# Altium footprint library Footprints_SOC.PcbLib: 201 footprints (part 4 of 13)
Each footprint in its own frame and in the unit in brackets; x right, y up, seen from the top. Pads: shape width x height; smd on the part's side, far side on the other; paste and mask are expansions set on the pad; w line width, h text height; cw(c..) or ccw(c..) is an arc to the next point about the centre after c.
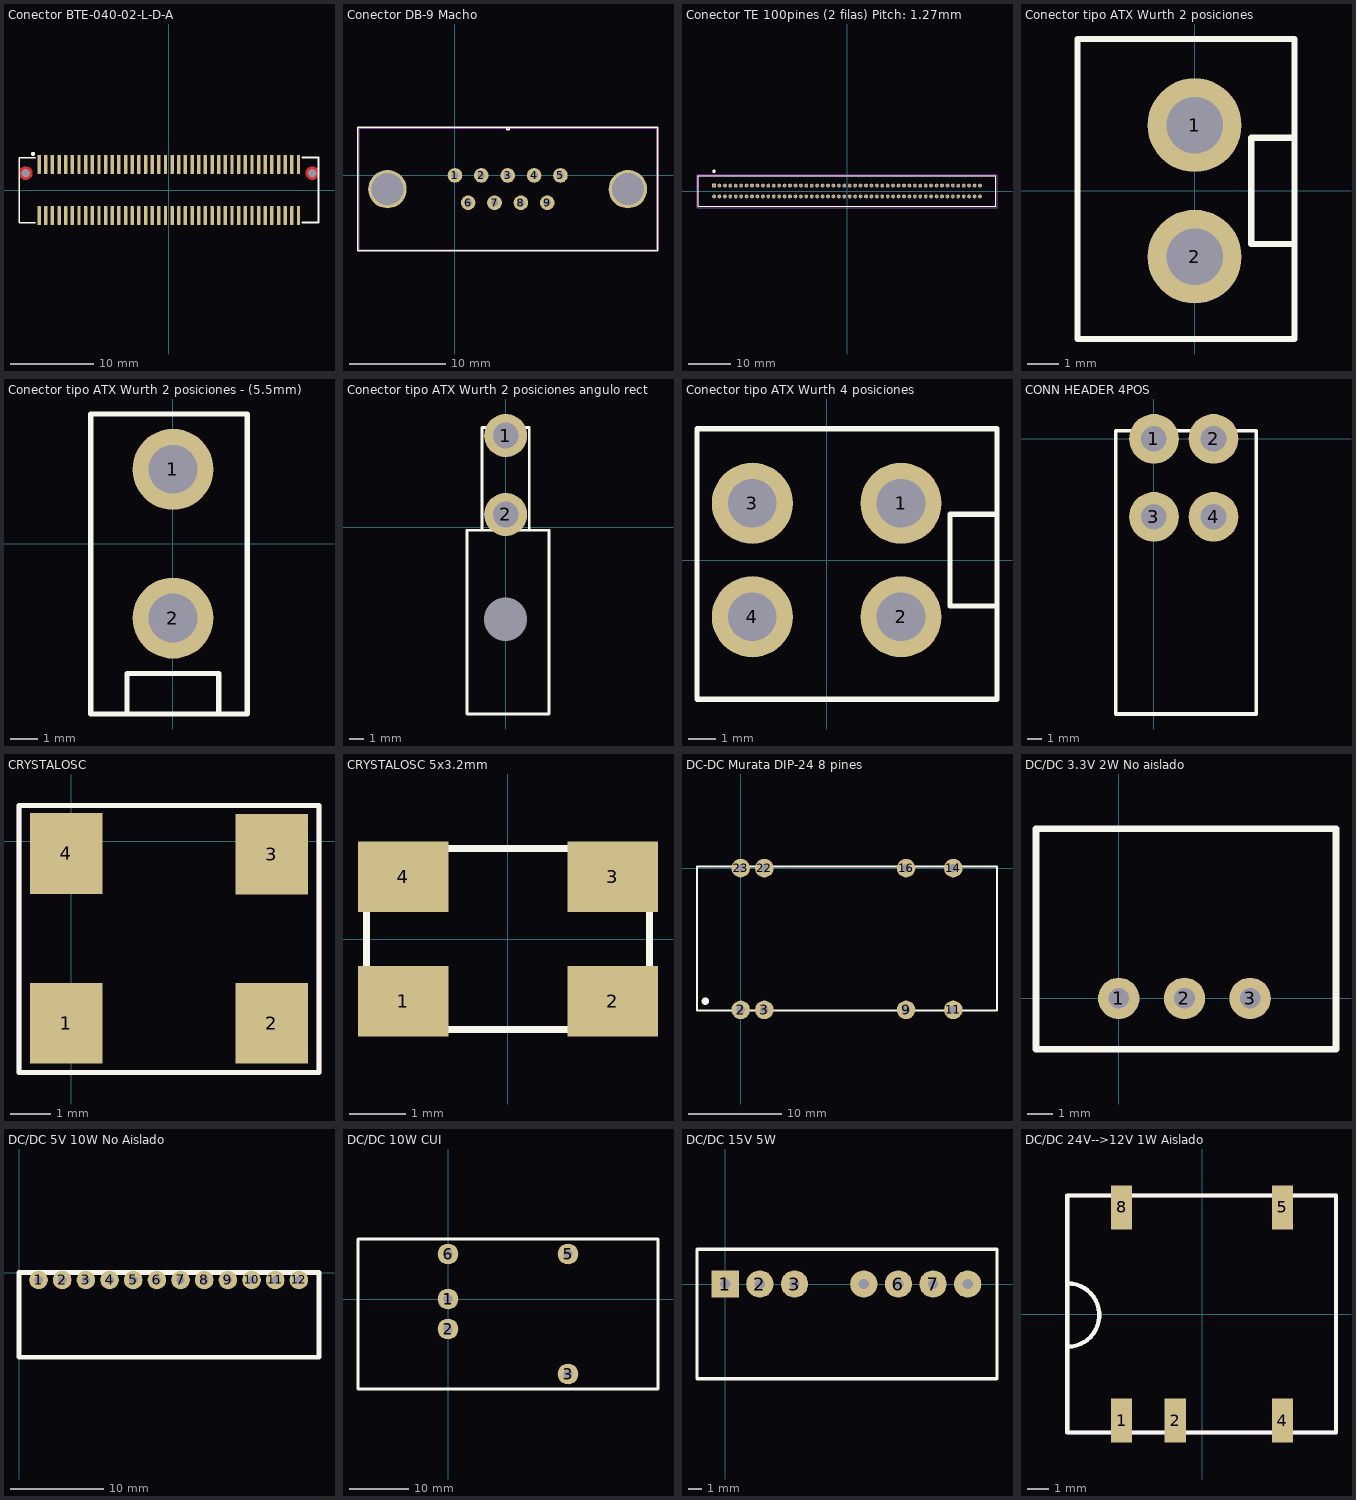
[diagram p3: the footprints below, top view; thin cyan lines are the x and y axes]

## Conector BTE-040-02-L-D-A [mm] "Conector Samtec 80 pines hembra altura 8mm pitch 0.8mm"
height 16
pads (82):
  rrect20% 0.41x2.273 smd: 1(-15.6,3.086) 2(-15.6,-3.086) 3(-14.8,3.086) 4(-14.8,-3.086) 5(-14,3.086) 6(-14,-3.086) 7(-13.2,3.086) 8(-13.2,-3.086) 9(-12.4,3.086) 10(-12.4,-3.086) 11(-11.6,3.086) 12(-11.6,-3.086) 13(-10.8,3.086) 14(-10.8,-3.086) 15(-10,3.086) 16(-10,-3.086) 17(-9.2,3.086) 18(-9.2,-3.086) 19(-8.4,3.086) 20(-8.4,-3.086) 21(-7.6,3.086) 22(-7.6,-3.086) 23(-6.8,3.086) 24(-6.8,-3.086) 25(-6,3.086) 26(-6,-3.086) 27(-5.2,3.086) 28(-5.2,-3.086) 29(-4.4,3.086) 30(-4.4,-3.086) 31(-3.6,3.086) 32(-3.6,-3.086) 33(-2.8,3.086) 34(-2.8,-3.086) 35(-2,3.086) 36(-2,-3.086) 37(-1.2,3.086) 38(-1.2,-3.086) 39(-0.4,3.086) 40(-0.4,-3.086) 41(0.4,3.086) 42(0.4,-3.086) 43(1.2,3.086) 44(1.2,-3.086) 45(2,3.086) 46(2,-3.086) 47(2.8,3.086) 48(2.8,-3.086) 49(3.6,3.086) 50(3.6,-3.086) 51(4.4,3.086) 52(4.4,-3.086) 53(5.2,3.086) 54(5.2,-3.086) 55(6,3.086) 56(6,-3.086) 57(6.8,3.086) 58(6.8,-3.086) 59(7.6,3.086) 60(7.6,-3.086) 61(8.4,3.086) 62(8.4,-3.086) 63(9.2,3.086) 64(9.2,-3.086) 65(10,3.086) 66(10,-3.086) 67(10.8,3.086) 68(10.8,-3.086) 69(11.6,3.086) 70(11.6,-3.086) 71(12.4,3.086) 72(12.4,-3.086) 73(13.2,3.086) 74(13.2,-3.086) 75(14,3.086) 76(14,-3.086) 77(14.8,3.086) 78(14.8,-3.086) 79(15.6,3.086) 80(15.6,-3.086)
  round 0.5 hole 1.02 unplated mask+0: ""(-17.238,2.032) ""(17.238,2.032)
Top Layer:
  pour cut-out: 18.065,2.043 18.037,2.252 17.956,2.446 17.828,2.613 17.661,2.742 17.466,2.822 17.258,2.85 17.049,2.822 16.854,2.742 16.687,2.613 16.559,2.446 16.478,2.252 16.451,2.043 16.478,1.834 16.559,1.639 16.687,1.472 16.854,1.344 17.049,1.263 17.258,1.236 17.466,1.263 17.661,1.344 17.828,1.472 17.956,1.639 18.037,1.834
  pour cut-out: -16.409,2.027 -16.436,2.236 -16.517,2.43 -16.645,2.597 -16.812,2.726 -17.007,2.806 -17.216,2.834 -17.424,2.806 -17.619,2.726 -17.786,2.597 -17.914,2.43 -17.995,2.236 -18.022,2.027 -17.995,1.818 -17.914,1.623 -17.786,1.456 -17.619,1.328 -17.424,1.247 -17.216,1.22 -17.007,1.247 -16.812,1.328 -16.645,1.456 -16.517,1.623 -16.436,1.818
Top Overlay:
  circle w0.25: c-16.34,4.346 r0.125
  lines w0.2: -16.05,-3.95 -18.002,-3.95 -18.002,3.9 -16.05,3.9 ; 16.05,-3.9 18.002,-3.9 18.002,3.92 16.05,3.92
3D body "BTE-040-02-L-D-A.stp": height 7.27, standoff -0.75, extent -18.002,-3.556 18.002,3.556

## Conector DB-9 Macho [mil] "P/N: 3-338309-2"
pads (11):
  round 60 hole 30: 1(0,0) 2(107.87,0) 3(215.75,0) 4(323.62,0) 5(431.5,0) 6(53.94,-111.81) 7(161.81,-111.81) 8(269.69,-111.81) 9(377.56,-111.81)
  round 157.48 hole 129.92 unplated: ""(-275.98,-55.91) ""(707.48,-55.91)
Top Overlay:
  lines w6: -396.57,-308.45 830.43,-308.45 830.43,197.55 -396.57,197.55 -396.57,-308.45 ; 211.93,187.55 221.93,187.55 221.93,197.55 211.93,197.55 211.93,187.55
Mechanical 1:
  lines w1: -391.57,-303.45 825.43,-303.45 825.43,192.55 -391.57,192.55 -391.57,-303.45
3D body "c-3-338309-2-e-3d.stp": height 480.31, standoff -127.95, extent -392.32,-300 823.82,188.19

## Conector TE 100pines (2 filas) Pitch: 1.27mm [mm] "P/N: 6-104068-7"
pads (100):
  rect 0.89x0.89 hole 0.56: 1(-31.115,1.27)
  round 0.89 hole 0.56: 2(-29.845,1.27) 3(-28.575,1.27) 4(-27.305,1.27) 5(-26.035,1.27) 6(-24.765,1.27) 7(-23.495,1.27) 8(-22.225,1.27) 9(-20.955,1.27) 10(-19.685,1.27) 11(-18.415,1.27) 12(-17.145,1.27) 13(-15.875,1.27) 14(-14.605,1.27) 15(-13.335,1.27) 16(-12.065,1.27) 17(-10.795,1.27) 18(-9.525,1.27) 19(-8.255,1.27) 20(-6.985,1.27) 21(-5.715,1.27) 22(-4.445,1.27) 23(-3.175,1.27) 24(-1.905,1.27) 25(-0.635,1.27) 26(0.635,1.27) 27(1.905,1.27) 28(3.175,1.27) 29(4.445,1.27) 30(5.715,1.27) 31(6.985,1.27) 32(8.255,1.27) 33(9.525,1.27) 34(10.795,1.27) 35(12.065,1.27) 36(13.335,1.27) 37(14.605,1.27) 38(15.875,1.27) 39(17.145,1.27) 40(18.415,1.27) 41(19.685,1.27) 42(20.955,1.27) 43(22.225,1.27) 44(23.495,1.27) 45(24.765,1.27) 46(26.035,1.27) 47(27.305,1.27) 48(28.575,1.27) 49(29.845,1.27) 50(31.115,1.27) 51(-31.115,-1.27) 52(-29.845,-1.27) 53(-28.575,-1.27) 54(-27.305,-1.27) 55(-26.035,-1.27) 56(-24.765,-1.27) 57(-23.495,-1.27) 58(-22.225,-1.27) 59(-20.955,-1.27) 60(-19.685,-1.27) 61(-18.415,-1.27) 62(-17.145,-1.27) 63(-15.875,-1.27) 64(-14.605,-1.27) 65(-13.335,-1.27) 66(-12.065,-1.27) 67(-10.795,-1.27) 68(-9.525,-1.27) 69(-8.255,-1.27) 70(-6.985,-1.27) 71(-5.715,-1.27) 72(-4.445,-1.27) 73(-3.175,-1.27) 74(-1.905,-1.27) 75(-0.635,-1.27) 76(0.635,-1.27) 77(1.905,-1.27) 78(3.175,-1.27) 79(4.445,-1.27) 80(5.715,-1.27) 81(6.985,-1.27) 82(8.255,-1.27) 83(9.525,-1.27) 84(10.795,-1.27) 85(12.065,-1.27) 86(13.335,-1.27) 87(14.605,-1.27) 88(15.875,-1.27) 89(17.145,-1.27) 90(18.415,-1.27) 91(19.685,-1.27) 92(20.955,-1.27) 93(22.225,-1.27) 94(23.495,-1.27) 95(24.765,-1.27) 96(26.035,-1.27) 97(27.305,-1.27) 98(28.575,-1.27) 99(29.845,-1.27) 100(31.115,-1.27)
Top Overlay:
  circle w0.4: c-31.115,4.607 r0.2
  lines w0.127: -34.849,-3.607 -34.849,3.607 34.849,3.607 34.849,-3.607 -34.849,-3.607
Bottom 3D Body:
  circle w0.4: c-31.115,4.607 r0.2
  circle w0.4: c-31.115,4.607 r0.2
  lines w0.127: -34.849,-3.607 -34.849,3.607 ; -34.849,-3.607 34.849,-3.607 ; -34.849,-3.607 -34.849,3.607 ; -34.849,-3.607 34.849,-3.607 ; -34.849,3.607 34.849,3.607 ; -34.849,3.607 34.849,3.607 ; 34.849,-3.607 34.849,3.607 ; 34.849,-3.607 34.849,3.607
Mechanical 16:
  lines w0.05: -35.099,-3.857 -35.099,3.857 35.099,3.857 35.099,-3.857 -35.099,-3.857
3D body "Conector 100pines (50x2) (6-104068-7).stp": height 11, standoff -1.45, extent -35.096,-3.569 34.6,5.169

## Conector tipo ATX Wurth 2 posiciones [mm] "Vertical Pitch 4.2 mm (64900211122)"
pads (2):
  round 3 hole 1.8: 1(0,2.1) 2(0,-2.1)
Top Overlay:
  lines w0.2: 3.17,-1.7 1.81,-1.7 1.81,-1.7 1.81,1.7 3.17,1.7 ; -3.74,-4.73 3.19,-4.73 3.19,4.85 -3.74,4.85 -3.74,-4.73
3D body "Conector tipo ATX 2 posiciones vertical.stp": height 12.9, standoff -3.4, extent -3.71,-4.73 3.19,4.87

## Conector tipo ATX Wurth 2 posiciones - (5.5mm) [mm] "Vertical Pitch 5.5 mm (64900221122)"
pads (2):
  round 3 hole 1.8: 1(0,2.75) 2(0,-2.75)
Top Overlay:
  lines w0.2: -1.7,-6.28 -1.7,-4.8 1.69,-4.8 1.69,-6.27 ; -3.046,-6.3 2.75,-6.3 2.75,4.8 -3.046,4.8 -3.046,-6.3
3D body "Conector tipo ATX 2 pos pitch 5.5mm (64900221122).stp": height 12.9, standoff -3.4, extent -3.046,-6.3 2.75,4.8

## Conector tipo ATX Wurth 2 posiciones angulo recto [mm] "Vertical Pitch 5.5 mm (649002227222)"
pads (3):
  round 3 hole 1.8: 1(0,6.4) 2(0,0.9)
  round 2 hole 3 unplated: ""(0,-6.4)
Top Overlay:
  lines w0.2: -1.64,-0.18 -1.64,6.97 1.64,6.97 ; 1.64,-0.19 1.64,6.96 ; -2.7,-13 3.02,-13 3.02,-0.2 -2.7,-0.2 -2.7,-13
3D body "Conector 2 pos angulo recto con board lock (649002227222).stp": height 11.65, standoff -3.3, extent -2.7,-13 2.996,6.97

## Conector tipo ATX Wurth 4 posiciones [mm] "Vertical Pitch 4.2x5.5 mm"
pads (4):
  round 3 hole 1.8: 1(2.75,2.1) 2(2.75,-2.1) 3(-2.75,2.1) 4(-2.75,-2.1)
Top Overlay:
  lines w0.2: 6.3,-1.7 4.56,-1.7 4.56,-1.7 4.56,1.7 6.3,1.7 ; -4.8,-5.146 6.3,-5.146 6.3,4.85 -4.8,4.85 -4.8,-5.146
3D body "conector Wurth tipo ATX vertical.stp": height 12.9, standoff -3.4, extent -4.8,-5.146 6.3,4.85

## CONN HEADER 4POS [mm] "Angulo recto pitch 4.2mm (64900429522)"
pads (4):
  round 3.5 hole 1.8: 1(0,0) 2(4.2,0) 3(0,-5.5) 4(4.2,-5.5)
Top Overlay:
  lines w0.254: -2.7,-19.4 7.22,-19.4 7.22,0.57 -2.7,0.57 -2.7,-19.4
3D body "Conector 4 posiciones angulo recto 4.2mm (64900429522).stp": height 11.7, standoff -3.2, extent -2.7,-19.4 7.22,0.57

## CRYSTALOSC [mm]
pads (4):
  rect 1.8x2 smd: 1(-0.12,-4.5) 2(4.96,-4.5) 3(4.96,-0.32) 4(-0.12,-0.3)
Top Overlay:
  lines w0.127: -1.29,-5.72 6.13,-5.72 6.13,0.89 -1.29,0.89 -1.29,-5.72
  text "." at -1.79,-4.82 h3
Top Assembly:
  lines w0.127: -1.29,-5.72 -1.29,0.89 6.13,0.89 6.13,-5.72 -1.29,-5.72
  text "." at -1.79,-4.82 h3
  text ".Designator" at -0.524,-3.257 h2
3D body "oscilador 50MHz.step": height 1.7, standoff 0, extent -1.04,-4.861 5.96,0.141

## CRYSTALOSC 5x3.2mm [mm] "P/N: ECS-80-18-30B-AGN-TR"
pads (4):
  rect 1.6x1.25 smd: 1(-1.85,-1.1) 2(1.85,-1.1) 3(1.85,1.1) 4(-1.85,1.1)
Top Overlay:
  lines w0.127: -2.5,-1.6 -2.5,1.6 2.5,1.6 2.5,-1.6 -2.5,-1.6
  text "." at -3.52,-1.42 h3
3D body "Crystal 5x3.2mm (ECS-100-20-30B-TR).STEP": height 0.85, standoff 0, extent -2.5,-1.6 2.5,1.6

## DC-DC Murata DIP-24 8 pines [mm] "P/N: NDTD0505C"
pads (8):
  round 2 hole 0.9: 2(0,-15.24) 3(2.54,-15.24) 9(17.78,-15.24) 11(22.86,-15.24) 14(22.86,0) 16(17.78,0) 22(2.54,0) 23(0,0)
Top Overlay:
  circle w0.4: c-3.8,-14.3 r0.2
  lines w0.2: -4.7,-15.327 27.56,-15.327 27.56,0.167 -4.7,0.167 -4.7,-15.327
3D body "DC-DC murata NDTD0505C.step": height 7.02, standoff -4.2, extent -4.7,-15.327 27.56,0.167

## DC/DC 3.3V 2W No aislado [mm] "P/N: R-78E3.3-0.5"
pads (3):
  round 1.6 hole 0.8: 1(0,0) 2(2.54,0) 3(5.08,0)
Top Overlay:
  lines w0.254: -3.2,-1.96 8.4,-1.96 8.4,6.55 -3.2,6.55 -3.2,-1.96
3D body "DC DC 3.3V 2W Recom (PN R-78E3.3-0.5).STEP": height 9.9, standoff -4.6, extent -3.2,-1.96 8.4,6.55

## DC/DC 5V 10W No Aislado [mm]
pads (12):
  round 2 hole 0.9: 1(2.1,-0.8) 2(4.64,-0.8) 3(7.18,-0.8) 4(9.72,-0.8) 5(12.26,-0.8) 6(14.8,-0.8) 7(17.34,-0.8) 8(19.88,-0.8) 9(22.42,-0.8) 10(24.96,-0.8) 11(27.5,-0.8) 12(30.04,-0.8)
Top Overlay:
  lines w0.5: 0,-9.1 0,0 32.2,0 32.2,-9.1 0,-9.1
  text "." at 0,0.7 h10
3D body: height 15, standoff 0, extent 0,-9.1 32.2,0

## DC/DC 10W CUI [mm]
pads (5):
  round 3.5 hole 1.5: 1(0,0) 2(0,-5.08) 3(20.32,-12.7) 5(20.32,7.62) 6(0,7.62)
Top Overlay:
  lines w0.5: -15.24,-15.24 35.56,-15.24 35.56,10.16 -15.24,10.16 -15.24,-15.24
3D body "CUI_PYB10-Q24-S5.step": height 11.8, standoff -4.1, extent -15.24,-15.24 35.56,10.16

## DC/DC 15V 5W [mm] "Marca MEAN WELL (SPB05A-15)"
pads (7):
  rect 2x2 hole 0.762: 1(0,0)
  round 2 hole 0.762: 2(2.54,0) 3(5.08,0) 6(12.7,0) 7(15.24,0) ""(10.16,0) ""(17.78,0)
Top Overlay:
  lines w0.254: -2.07,-6.95 19.93,-6.95 19.93,2.55 -2.07,2.55 -2.07,-6.95
3D body "CUI_PQMC3-D5-D5-S.step": height 12.3, standoff -3.8, extent -2.07,-6.95 19.93,2.55

## DC/DC 24V-->12V 1W Aislado [mm] "CUI Inc. P/N: PDS1-S24-S12-M-TR"
pads (5):
  rect 1x2.1 smd: 1(-3.81,-5.05) 2(-1.27,-5.05) 4(3.81,-5.05) 5(3.81,5.05) 8(-3.81,5.05)
Top Overlay:
  lines w0.2: -6.37,-1.55 ccw(c-6.37,-0.05) -6.37,1.45 ; -6.39,-5.622 -6.39,5.62 6.35,5.62 6.35,-5.622 -6.39,-5.622
Top Assembly:
  lines w0.2: -6.37,-1.55 ccw(c-6.37,-0.05) -6.37,1.45 ; -6.39,-5.622 -6.39,5.62 6.35,5.62 6.35,-5.622 -6.39,-5.622
  text ".Designator" at -3.624,-0.657 h2
3D body "CUI_PDS1-S24-S12-M.step": height 7, standoff -0.25, extent -6.35,-5.622 6.35,5.622